# Altium footprint library AD_Lib.PcbLib: 508 footprints (part 28 of 32)
Each footprint in its own frame and in the unit in brackets; x right, y up, seen from the top. Pads: shape width x height; smd on the part's side, far side on the other; paste and mask are expansions set on the pad; w line width, h text height; cw(c..) or ccw(c..) is an arc to the next point about the centre after c.
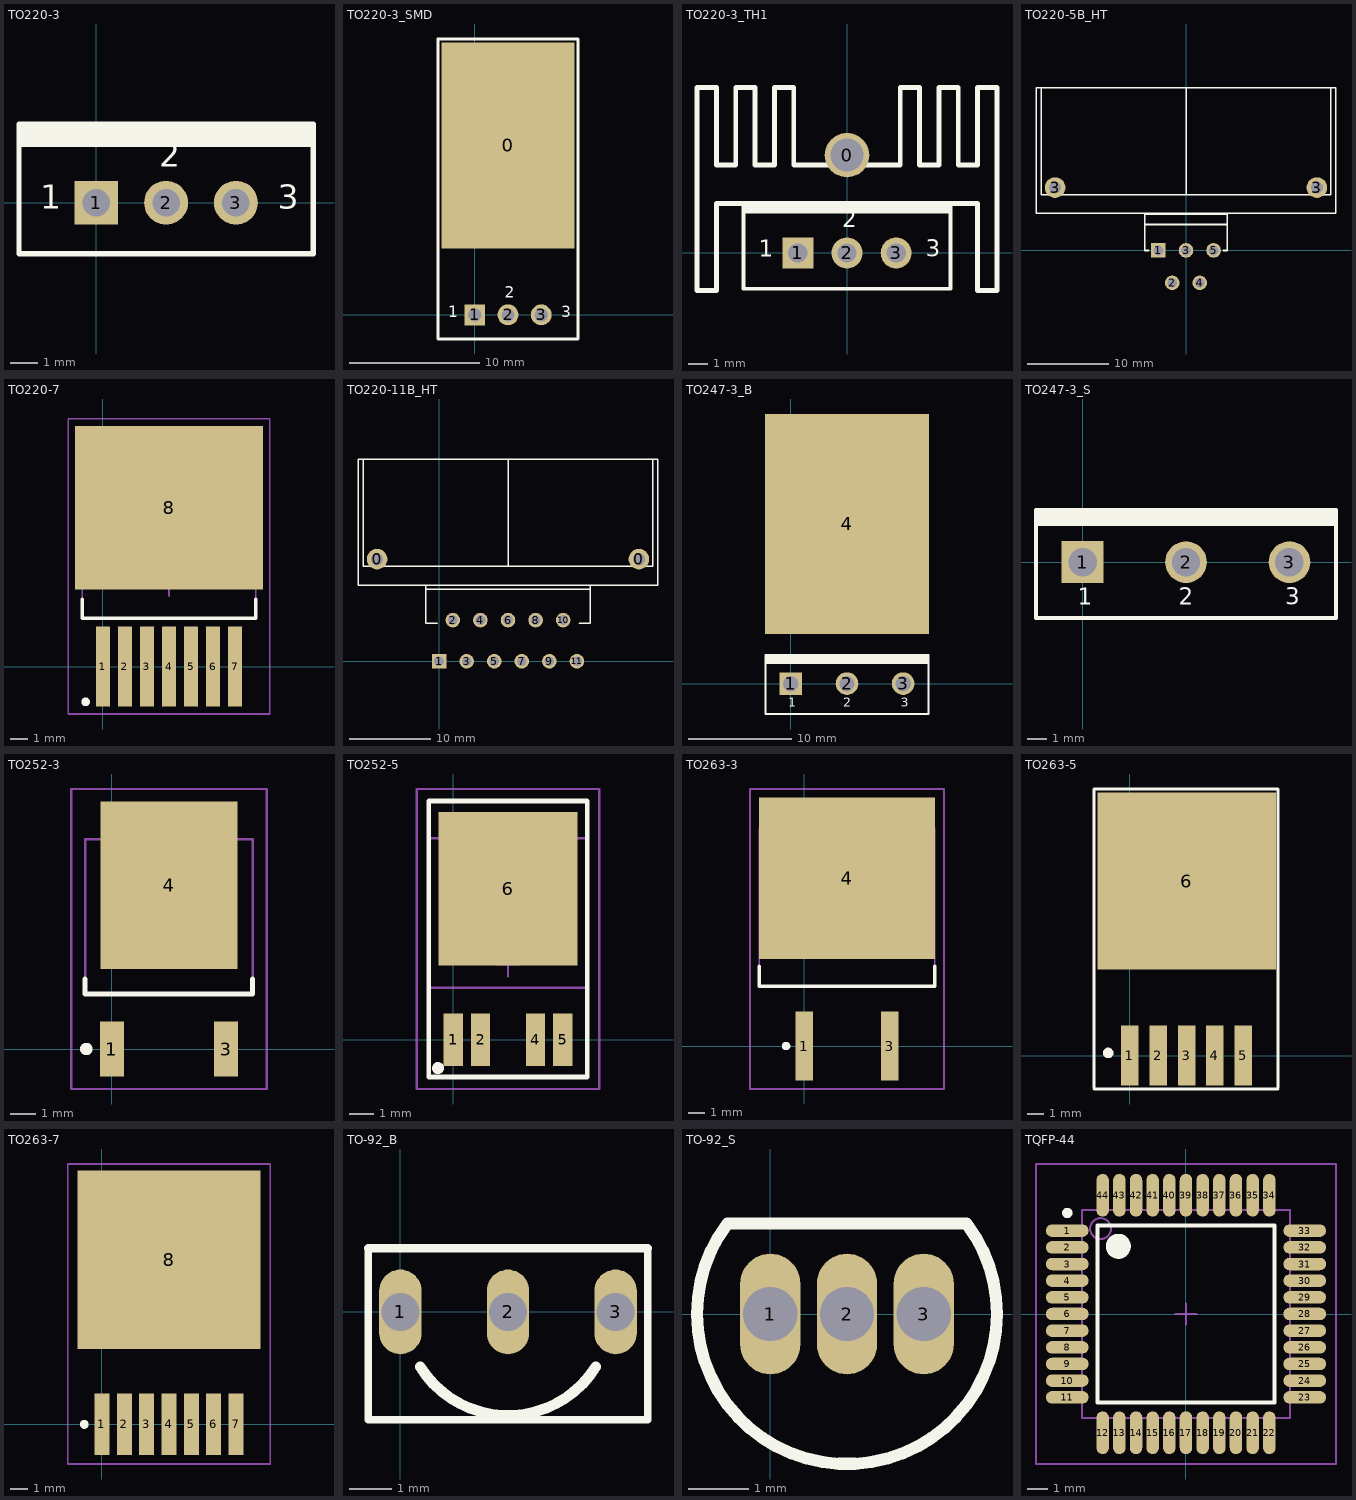
[diagram p27: the footprints below, top view; thin cyan lines are the x and y axes]

## TO220-3 [mm] "TO, Thru-Hole, Vertical, Heatsink Mounted; 3 In-Line Leads; Pitch 2.54 mm"
height 19.3
pads (3):
  rect 1.6x1.6 hole 1: 1(0,0)
  round 1.6 hole 1: 2(2.54,0) 3(5.08,0)
Top Overlay:
  rectangle: -2.81,2.032 7.89,2.85
  lines w0.2: -2.81,-1.85 7.89,-1.85 7.89,2.85 -2.81,2.85 -2.81,-1.85
  text "2" at 2.286,1.016 h1.5
  text "1" at -2.032,-0.508 h1.5
  text "3" at 6.604,-0.508 h1.5
Bottom Overlay:
  text "3" at 7.112,-0.508 h1.5
  text "2" at 2.794,1.016 h1.5
  text "1" at -1.524,-0.508 h1.5

## TO220-3_SMD [mm] "TO, Thru-Hole, Vertical, Heatsink Mounted; 3 In-Line Leads; Pitch 2.54 mm"
height 19.3
pads (4):
  rect 10.16x15.748 smd paste+0 mask+0: 0(2.54,12.954)
  rect 1.6x1.6 hole 1: 1(0,0)
  round 1.6 hole 1: 2(2.54,0) 3(5.08,0)
Top Overlay:
  lines w0.2: -2.826,21.082 7.874,21.082 ; -2.81,21.082 -2.81,-1.85 7.89,-1.85 7.89,21.082
  text "3" at 6.604,-0.508 h1.5
  text "1" at -2.032,-0.508 h1.5
  text "2" at 2.286,1.016 h1.5
Bottom Overlay:
  text "1" at -1.524,-0.508 h1.5
  text "2" at 2.794,1.016 h1.5
  text "3" at 7.112,-0.508 h1.5

## TO220-3_TH1 [mm] "H型散热片，JLC物料号C4649"
height 19.3
pads (4):
  round 2.3 hole 1.7: 0(0,5.055)
  rect 1.6x1.6 hole 1: 1(-2.54,0)
  round 1.6 hole 1: 2(0,0) 3(2.54,0)
Top Overlay:
  rectangle: -5.35,2.032 5.35,2.555
  lines w0.2: -5.35,2.555 -5.35,-1.85 5.35,-1.85 5.35,2.555
  lines w0.254: -7.75,-1.945 -6.75,-1.945 -6.75,2.555 6.75,2.555 6.75,-1.945 7.75,-1.945 7.75,8.555 6.75,8.555 6.75,4.555 5.75,4.555 5.75,8.555 4.75,8.555 4.75,4.555 3.75,4.555 3.75,8.555 2.75,8.555 2.75,4.555 -2.75,4.555 -2.75,8.555 -3.75,8.555 -3.75,4.555 -4.75,4.555 -4.75,8.555 -5.75,8.555 -5.75,4.555 -6.75,4.555 -6.75,8.555 -7.75,8.555 -7.75,-1.945
  text "3" at 4.064,-0.508 h1.5
  text "1" at -4.572,-0.508 h1.5
  text "2" at -0.254,1.016 h1.5
Bottom Overlay:
  text "1" at -4.064,-0.508 h1.5
  text "2" at 0.254,1.016 h1.5
  text "3" at 4.572,-0.508 h1.5

## TO220-5B_HT [mm] "TO, Thru-Hole, Vertical, Heatsink Mounted; 5 Bent Staggered Leads; Pitch 1.7 mm"
height 21
pads (7):
  rect 1.8x1.8 hole 1.2: 1(-3.4,0)
  round 1.8 hole 1.2: 2(-1.7,-4) 3(0,0) 4(1.7,-4) 5(3.4,0)
  round 2.54 hole 1.524: 3(-16.15,7.758) 3(16.15,7.758)
Top Overlay:
  lines w0.178: -17.865,20.058 -17.865,6.858 17.822,6.858 17.822,20.058 ; 0,6.858 0,20.058 ; 18.463,4.558 -18.5,4.558 -18.5,20.058 18.5,20.058 18.5,4.558
  lines w0.2: -5.08,3.2 5.08,3.2 ; -4.572,0 -5.08,0 -5.08,4.47 5.08,4.47 5.08,0 4.572,0
Bottom Overlay:
  text "5" at 3.723,1.397 h1.5
  text "3" at 0.323,1.397 h1.5
  text "1" at -3.077,1.397 h1.5
  text "4" at 2.023,-2.603 h1.5
  text "2" at -1.377,-2.603 h1.5

## TO220-7 [mm] "TO,1.27mm pitch;7 pin,13.85mm L X 9.25mm W X 4.50mm H body"
height 4.5
pads (8):
  rect 0.8x4.6 smd paste+0 mask+0: 1(0,0) 2(1.27,0) 3(2.54,0) 4(3.81,0) 5(5.08,0) 6(6.35,0) 7(7.62,0)
  rect 10.8x9.4 smd paste+0 mask+0: 8(3.81,9.15)
Top Overlay:
  circle w0.25: c-0.99,-2.025 r0.125
  lines w0.2: -1.19,3.875 -1.19,2.775 8.81,2.775 8.81,3.875
Mechanical 13:
  lines w0.1: -1.19,2.775 -1.19,12.025 8.81,12.025 8.81,2.775 -1.19,2.775
Mechanical 15:
  lines w0.1: 3.31,4.575 4.31,4.575 ; 3.81,4.075 3.81,5.075 ; -1.99,-2.725 -1.99,14.275 9.61,14.275 9.61,-2.725 -1.99,-2.725
3D body "PG-TO220-7-4.stp": height 4.51, standoff 0, extent -1.19,-1.15 8.81,12.7

## TO220-11B_HT [mm] "TO, Thru-Hole, Vertical, Heatsink Mounted; 11 Bent Staggered Leads; Pitch 1.7 mm"
height 20.8
pads (13):
  round 2.54 hole 1.524: 0(-7.65,12.598) 0(24.65,12.598)
  rect 1.8x1.8 hole 1.2: 1(0,0)
  round 1.8 hole 1.2: 2(1.7,5.08) 3(3.4,0) 4(5.1,5.08) 5(6.8,0) 6(8.5,5.08) 7(10.2,0) 8(11.9,5.08) 9(13.6,0) 10(15.3,5.08) 11(17,0)
Top Overlay:
  lines w0.178: -9.365,24.898 -9.365,11.698 26.322,11.698 26.322,24.898 ; 8.5,11.698 8.5,24.898 ; 26.963,9.398 -10,9.398 -10,24.898 27,24.898 27,9.398
  lines w0.2: -1.65,8.87 18.65,8.87 ; -0.254,4.67 -1.65,4.67 -1.65,9.37 18.65,9.37 18.65,4.67 17.274,4.67
Bottom Overlay:
  text "11" at 17.323,1.397 h1.5
  text "9" at 13.923,1.397 h1.5
  text "7" at 10.523,1.397 h1.5
  text "5" at 7.123,1.397 h1.5
  text "3" at 3.723,1.397 h1.5
  text "1" at 0.323,1.397 h1.5
  text "10" at 15.623,6.477 h1.5
  text "8" at 12.223,6.477 h1.5
  text "6" at 8.823,6.477 h1.5
  text "4" at 5.423,6.477 h1.5
  text "2" at 2.023,6.477 h1.5

## TO247-3_B [mm] "弯脚TO, Thru-Hole, Vertical, Heatsink Mounted; 3 In-Line Leads; Pitch 5.45 mm"
height 26.8
pads (4):
  rect 2.2x2.2 hole 1.5: 1(0,0)
  round 2.2 hole 1.5: 2(5.45,0) 3(10.9,0)
  rect 15.9x21.336 smd: 4(5.45,15.494)
Top Overlay:
  rectangle: -2.45,1.905 13.35,2.75
  lines w0.2: -2.45,-2.95 -2.45,2.75 13.35,2.75 13.35,-2.95 -2.45,-2.95
  text "3" at 10.668,-2.54 h1.52
  text "2" at 5.08,-2.54 h1.52
  text "1" at -0.254,-2.54 h1.52
Bottom Overlay:
  text "3" at 11.176,-2.54 h1.52
  text "2" at 5.588,-2.54 h1.52
  text "1" at 0.254,-2.54 h1.52
Mechanical 1:
  circle w0.254: c5.45,19.05 r1.67

## TO247-3_S [mm] "直脚TO, Thru-Hole, Vertical, Heatsink Mounted; 3 In-Line Leads; Pitch 5.45 mm"
height 26.8
pads (3):
  rect 2.2x2.2 hole 1.5: 1(0,0)
  round 2.2 hole 1.5: 2(5.45,0) 3(10.9,0)
Top Overlay:
  rectangle: -2.45,1.905 13.35,2.75
  lines w0.2: -2.45,-2.95 -2.45,2.75 13.35,2.75 13.35,-2.95 -2.45,-2.95
  text "1" at -0.254,-2.54 h1.52
  text "2" at 5.08,-2.54 h1.52
  text "3" at 10.668,-2.54 h1.52
Bottom Overlay:
  text "1" at 0.254,-2.54 h1.52
  text "2" at 5.588,-2.54 h1.52
  text "3" at 11.176,-2.54 h1.52

## TO252-3 [mm] "D-PAK, 4-Leads, Body 6.1x6.5mm, Pitch 2.28mm, Lead Span 9.8mm, IPC Low Density"
height 2.38
pads (3):
  rect 0.95x2.2 smd: 1(0,0) 3(4.56,0)
  rect 5.5x6.7 smd: 4(2.28,6.55)
Top Overlay:
  circle w0.25: c-1.025,0 r0.125
  lines w0.2: -1.07,2.8 -1.07,2.2 5.63,2.2 5.63,2.8
Mechanical 13:
  lines w0.1: -1.07,2.2 5.63,2.2 5.63,8.4 -1.07,8.4 -1.07,2.2
Mechanical 15:
  lines w0.1: -1.62,-1.6 6.18,-1.6 6.18,10.4 -1.62,10.4 -1.62,-1.6
3D body: height 2.38, standoff 0, extent -1.07,2.2 5.63,8.4

## TO252-5 [mm] "D-PAK, 4-Leads, Body 6.1x6.5mm, Pitch 2.28mm, Lead Span 9.8mm, IPC Low Density"
height 2.38
pads (5):
  rect 0.8x2.2 smd paste+0 mask+0: 1(0,0) 2(1.14,0) 4(3.42,0) 5(4.56,0)
  rect 5.8x6.4 smd paste+0 mask+0: 6(2.28,6.3)
Top Overlay:
  circle w0.25: c-0.635,-1.179 r0.125
  lines w0.2: -1.02,-1.55 -1.02,9.95 5.58,9.95 5.58,-1.55 -1.02,-1.55
Mechanical 13:
  lines w0.1: -0.97,2.17 -0.97,8.39 5.53,8.39 5.53,2.17 -0.97,2.17
Mechanical 15:
  lines w0.1: 1.78,3.15 2.78,3.15 ; 2.28,2.65 2.28,3.65 ; -1.52,-2.05 6.08,-2.05 6.08,10.45 -1.52,10.45 -1.52,-2.05
3D body "PG-TO252-5-11.stp": height 2.36, standoff 0, extent -0.97,-0.79 5.53,9.19

## TO263-3 [mm] "D2-PAK, 4-Leads, Body 9.3x10.2mm, Pitch 2.54mm, Lead Span 15.2mm, IPC Low Density"
height 4.57
pads (3):
  rect 1.05x4.1 smd: 1(0,0) 3(5.08,0)
  rect 10.45x9.6 smd: 4(2.54,9.95)
Top Overlay:
  circle w0.25: c-1.075,0 r0.125
  lines w0.2: -2.66,4.75 -2.66,3.55 7.74,3.55 7.74,4.75
Mechanical 13:
  lines w0.1: -2.66,3.55 7.74,3.55 7.74,12.95 -2.66,12.95 -2.66,3.55
Mechanical 15:
  lines w0.1: 2.04,6.35 3.04,6.35 ; 2.54,5.85 2.54,6.85 ; -3.21,-2.55 8.29,-2.55 8.29,15.25 -3.21,15.25 -3.21,-2.55
3D body: height 4.57, standoff 0, extent -2.66,3.55 7.74,12.95

## TO263-5 [mm] "LM2576系列贴片元件，NS内部编号TS5B"
height 4.65
pads (6):
  rect 1.05x3.6 smd: 1(0,0) 2(1.7,0) 3(3.4,0) 4(5.1,0) 5(6.8,0)
  rect 10.7x10.6 smd: 6(3.4,10.45)
Top Overlay:
  circle w0.381: c-1.297,0.153 r0.125
  lines w0.178: -2.159,-2.005 8.89,-2.005 ; -2.159,-1.905 -2.159,15.97 8.89,15.97 8.89,-1.905
Mechanical 15:
  lines w0.1: 2.9,6 3.9,6 ; 3.4,5.5 3.4,6.5

## TO263-7 [mm] "D2-PAK, 8-Leads, Body 9.9x10.2mm, Pitch 1.27mm, Lead Span 14mm, IPC Low Density"
height 2.1
pads (8):
  rect 0.85x3.5 smd: 1(0,0) 2(1.27,0) 3(2.54,0) 4(3.81,0) 5(5.08,0) 6(6.35,0) 7(7.62,0)
  rect 10.414x10.16 smd: 8(3.81,9.352)
Top Overlay:
  circle w0.25: c-1.005,0 r0.125
Mechanical 15:
  lines w0.1: -1.94,-2.25 9.56,-2.25 9.56,14.8 -1.94,14.8 -1.94,-2.25

## TO-92_B [mm] "弯脚;"
height 4.96
pads (3):
  oval 1x2 hole 0.9: 1(0,0) 2(2.54,0) 3(5.08,0)
Top Overlay:
  lines w0.178: -0.762,1.5 -0.762,-2.54 5.842,-2.54 5.842,1.5
  lines w0.2: -0.762,1.5 5.842,1.5
  lines w0.254: 0.468,-1.295 ccw(c2.54,0) 4.612,-1.295

## TO-92_S [mm] "直脚;TO, Flat Index; 3 In-Line, Axial Leads; Body Dia. 4.7mm; Leads 0.56 x 0.51 mm (max)"
height 4.96
pads (3):
  oval 1x2 hole 0.9: 1(0,0) 2(1.27,0) 3(2.54,0)
Top Overlay:
  lines w0.2: -0.71,1.5 ccw(c1.27,0) 3.25,1.5 -0.71,1.5

## TQFP-44 [mm] "Thin QFP, 44-Leads, Body 10x10mm, Pitch 0.8mm, IPC Low Density"
height 1.2
pads (44):
  oval 2.05x0.6 smd: 1(-5.7,4) 2(-5.7,3.2) 3(-5.7,2.4) 4(-5.7,1.6) 5(-5.7,0.8) 6(-5.7,0) 7(-5.7,-0.8) 8(-5.7,-1.6) 9(-5.7,-2.4) 10(-5.7,-3.2) 11(-5.7,-4) 23(5.7,-4) 24(5.7,-3.2) 25(5.7,-2.4) 26(5.7,-1.6) 27(5.7,-0.8) 28(5.7,0) 29(5.7,0.8) 30(5.7,1.6) 31(5.7,2.4) 32(5.7,3.2) 33(5.7,4)
  oval 0.6x2.05 smd: 12(-4,-5.7) 13(-3.2,-5.7) 14(-2.4,-5.7) 15(-1.6,-5.7) 16(-0.8,-5.7) 17(0,-5.7) 18(0.8,-5.7) 19(1.6,-5.7) 20(2.4,-5.7) 21(3.2,-5.7) 22(4,-5.7) 34(4,5.7) 35(3.2,5.7) 36(2.4,5.7) 37(1.6,5.7) 38(0.8,5.7) 39(0,5.7) 40(-0.8,5.7) 41(-1.6,5.7) 42(-2.4,5.7) 43(-3.2,5.7) 44(-4,5.7)
Top Overlay:
  circle w0.25: c-5.7,4.85 r0.125
  circle w0.6: c-3.25,3.25 r0.3
  lines w0.2: -4.25,-4.25 -4.25,4.25 4.25,4.25 4.25,-4.25 -4.25,-4.25
Mechanical 13:
  circle w0.1: c-4.1,4.1 r0.5
  lines w0.1: -5,-5 -5,5 5,5 5,-5 -5,-5
Mechanical 15:
  lines w0.1: -0.5,0 0.5,0 ; 0,-0.5 0,0.5 ; -7.2,-7.2 -7.2,7.2 7.2,7.2 7.2,-7.2 -7.2,-7.2
3D body: height 1.2, standoff 0, extent -5,-5 5,5